# Altium footprint library AD_Lib.PcbLib: 508 footprints (part 4 of 32)
Each footprint in its own frame and in the unit in brackets; x right, y up, seen from the top. Pads: shape width x height; smd on the part's side, far side on the other; paste and mask are expansions set on the pad; w line width, h text height; cw(c..) or ccw(c..) is an arc to the next point about the centre after c.
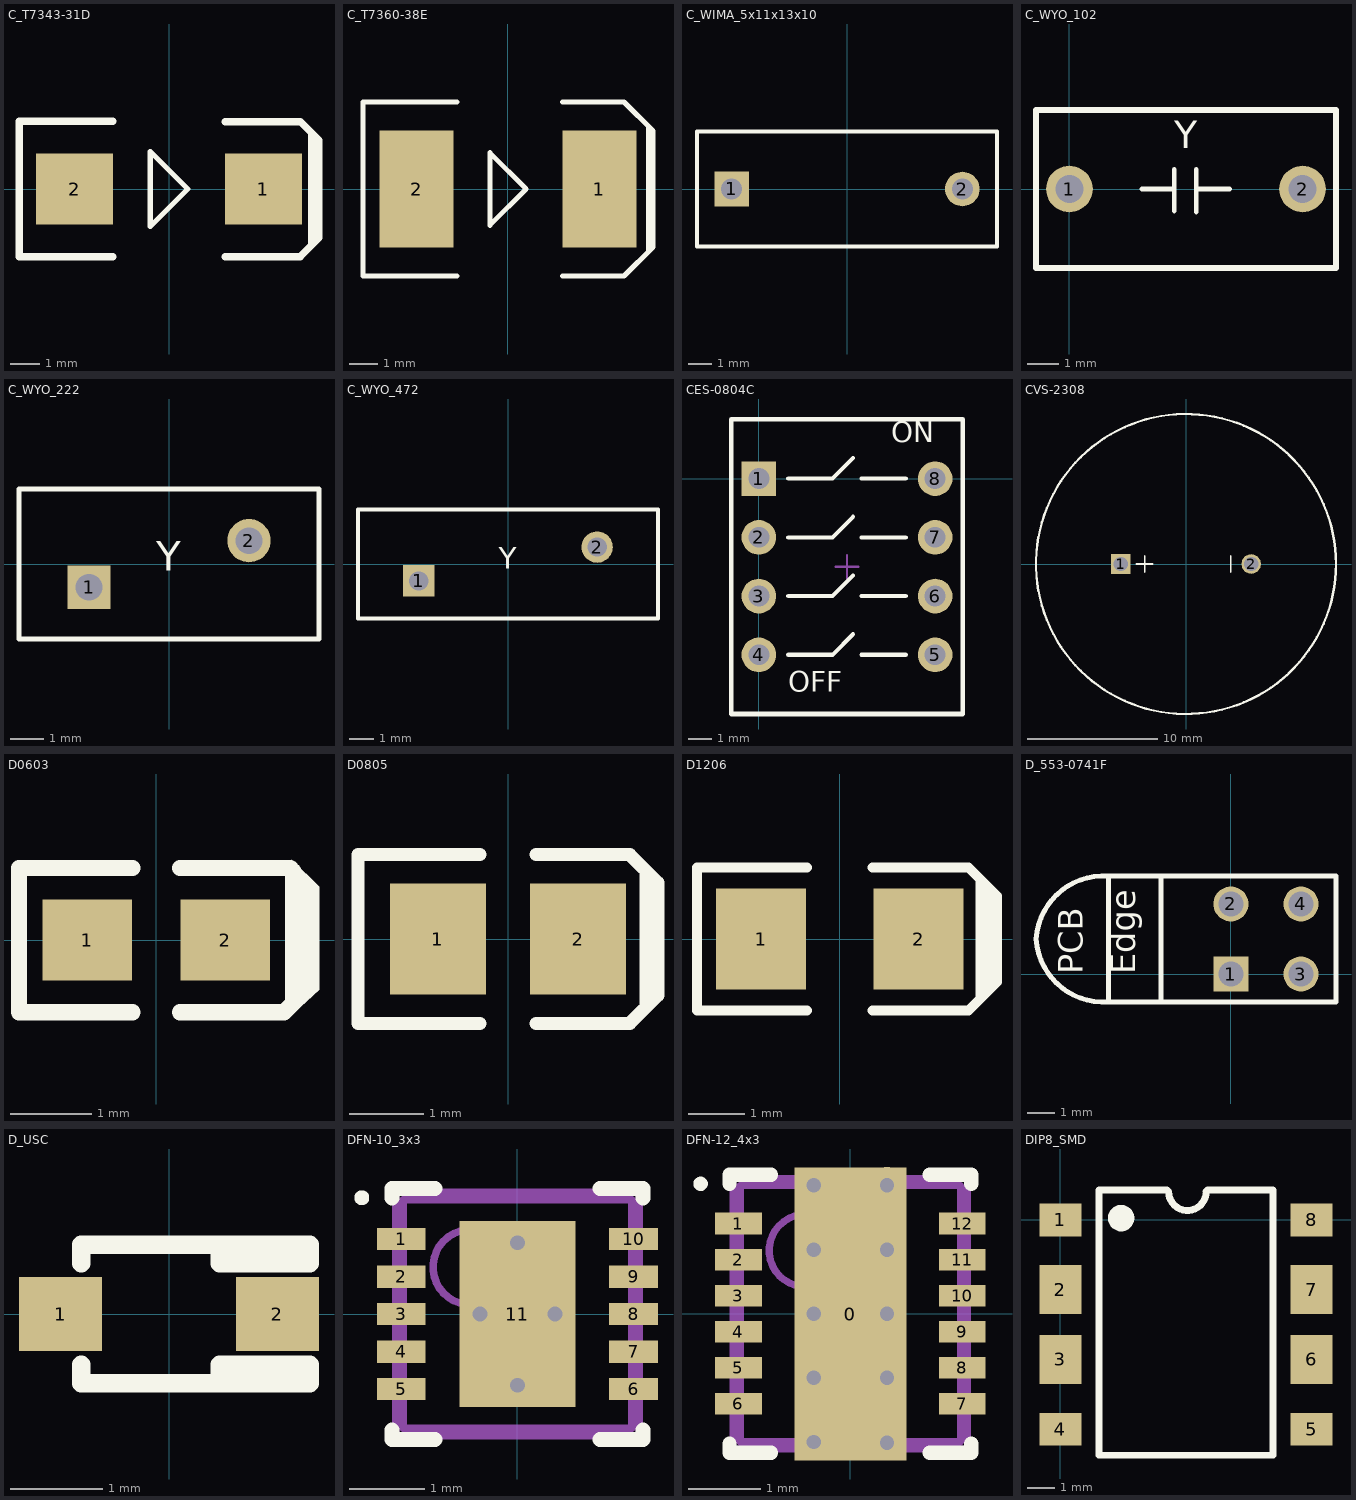
[diagram p3: the footprints below, top view; thin cyan lines are the x and y axes]

## C_T7343-31D [mm] "钽电容；KEMET-D型"
height 2.896
pads (2):
  rect 2.6x2.4 smd: 1(3.2,0) 2(-3.2,0)
Top Overlay:
  rectangle: 4.699,-1.93 4.953,1.905
  lines w0.178: -0.635,-1.27 0.635,0 -0.635,1.27 -0.635,-1.27
  lines w0.254: -1.905,-2.3 -5.08,-2.3 -5.08,2.3 -1.905,2.3 ; 1.905,-2.3 4.445,-2.3 ; 1.905,2.286 4.445,2.286 5.08,1.651 5.08,-1.651 4.445,-2.286

## C_T7360-38E [mm] "钽电容；KEMET-E型"
height 3.454
pads (2):
  rect 2.6x4.1 smd: 1(3.2,0) 2(-3.2,0)
Top Overlay:
  rectangle: 4.826,-2.159 5.004,2.21
  lines w0.178: -1.778,-3.048 -5.08,-3.048 -5.08,3.048 -1.778,3.048 ; 1.905,-3.048 4.064,-3.048 5.08,-2.032 5.08,2.032 4.064,3.048 1.905,3.048 ; -0.635,-1.27 0.635,0 -0.635,1.27 -0.635,-1.27

## C_WIMA_5x11x13x10 [mm] "WIMA电容，WxHxLxPCM"
height 11
pads (2):
  rect 1.5x1.5 hole 0.9: 1(-5,0)
  round 1.5 hole 0.9: 2(5,0)
Top Overlay:
  lines w0.178: -6.5,-2.5 6.5,-2.5 6.5,2.5 -6.5,2.5 -6.5,-2.5

## C_WYO_102 [mm] "Radial Cap, Thru-Hole; 2 Leads; 0.3 in Pin Spacing"
height 6
pads (2):
  round 1.5 hole 0.9: 1(0,0) 2(7.5,0)
Top Overlay:
  lines w0.152: 2.328,0 3.369,0 ; 3.369,-0.711 3.369,0.635 ; 4.08,-0.737 4.08,0.635 ; 4.106,0 5.147,0
  lines w0.203: -1.076,-2.54 -1.076,2.54 8.576,2.54 8.576,-2.54 -1.076,-2.54
  text "Y" at 3.369,1.016 h1.52

## C_WYO_222 [mm] "Vishay WYO系列Y电容"
height 3
pads (2):
  rect 1.3x1.3 hole 0.8 paste+0 mask+0.076: 1(-2.4,-0.7)
  round 1.3 hole 0.8 paste+0 mask+0.076: 2(2.4,0.7)
Top Overlay:
  lines w0.152: -4.5,-2.25 -4.5,2.25 4.5,2.25 4.5,-2.25 -4.5,-2.25
  text "Y" at -0.381,-0.508 h1.52

## C_WYO_472 [mm] "Vishay WYO系列Y电容"
height 12.5
pads (2):
  rect 1.3x1.3 hole 0.8 paste+0 mask+0.076: 1(-3.684,-0.7)
  round 1.3 hole 0.8 paste+0 mask+0.076: 2(3.684,0.7)
Top Overlay:
  lines w0.152: -6.2,-2.25 6.2,-2.25 6.2,2.25 -6.2,2.25 -6.2,-2.25
  text "Y" at -0.381,-0.508 h1.52

## CES-0804C [mm] "DIP; 8 Leads; Row Spacing 7.62 mm; Pitch 2.54 mm"
height 12
pads (8):
  rect 1.5x1.5 hole 0.9: 1(0,0)
  round 1.5 hole 0.9: 2(0,-2.54) 3(0,-5.08) 4(0,-7.62) 5(7.62,-7.62) 6(7.62,-5.08) 7(7.62,-2.54) 8(7.62,0)
Top Overlay:
  lines w0.178: 1.27,-7.62 3.175,-7.62 4.064,-6.731 ; 1.27,-5.08 3.175,-5.08 4.064,-4.191 ; 1.27,-2.54 3.175,-2.54 4.064,-1.651 ; 1.27,0 3.175,0 4.064,0.889 ; 4.445,-7.62 6.35,-7.62 ; 4.445,-5.08 6.35,-5.08 ; 4.445,-2.54 6.35,-2.54 ; 4.445,0 6.35,0
  lines w0.2: -1.19,-10.18 -1.19,2.56 8.81,2.56 8.81,-10.18 -1.19,-10.18
  text "ON" at 5.715,1.27 h1.52
  text "OFF" at 1.27,-9.525 h1.52
Mechanical 15:
  lines w0.1: 3.31,-3.81 4.31,-3.81 ; 3.81,-4.31 3.81,-3.31

## CVS-2308 [mm] "直插扬声器"
height 8.4
pads (2):
  rect 1.5x1.5 hole 1.1: 1(-5,0)
  round 1.5 hole 1.1: 2(5,0)
Top Overlay:
  circle w0.178: c0,0 r11.5
  lines w0.127: -3.81,0 -2.54,0 ; -3.175,-0.635 -3.175,0.635 ; 3.429,-0.635 3.429,0.635

## D0603 [mm] "LED"
height 1.1
pads (2):
  rect 1.1x1 smd: 1(-0.85,0) 2(0.85,0)
Top Overlay:
  region: 1.626,-0.965 1.626,0.946 1.674,0.993 2.007,0.66 2.007,-0.61
  lines w0.2: -0.293,-0.889 -1.69,-0.889 -1.69,0.889 -0.293,0.889 ; 0.293,-0.889 1.575,-0.889 1.69,-0.774 1.69,0.85 1.651,0.889 0.293,0.889

## D0805 [mm] "贴片LED"
height 1.1
pads (2):
  rect 1.3x1.5 smd: 1(-0.95,0) 2(0.95,0)
Top Overlay:
  rectangle: 1.778,-0.889 2.032,0.889
  lines w0.178: -0.381,-1.143 -2.032,-1.143 -2.032,1.143 -0.381,1.143 ; 0.381,-1.143 1.651,-1.143 ; 0.381,1.143 1.651,1.143 2.032,0.762 2.032,-0.762 1.651,-1.143 ; 1.397,-1.143 1.651,-1.143

## D1206 [mm] "公制3216；英制1206；功率1/4W"
height 0.71
pads (2):
  rect 1.6x1.8 smd: 1(-1.4,0) 2(1.4,0)
Top Overlay:
  region: 2.413,-1.143 2.413,1.047 2.461,1.095 2.794,0.762 2.794,-0.762
  lines w0.178: -0.584,-1.27 -2.54,-1.27 -2.54,1.27 -0.584,1.27 ; 0.584,-1.27 2.286,-1.27 2.794,-0.762 2.794,0.762 2.286,1.27 0.584,1.27

## D_553-0741F [mm] "Dialight之直插双色指示灯"
height 9.65
pads (4):
  rect 1.27x1.27 hole 0.9: 1(0,0)
  round 1.27 hole 0.9: 2(0,2.54) 3(2.54,0) 4(2.54,2.54)
Top Overlay:
  lines w0.178: -2.54,-1.016 -2.54,3.556 ; -4.445,-1.016 cw(c-4.61,1.435) -7.061,1.27 cw(c-4.61,1.105) -4.445,3.556 ; -4.445,-1.016 3.81,-1.016 3.81,3.556 -4.445,3.556 ; -4.445,-1.016 -4.445,3.556
  text "Edge" at -3.175,0 h1.52
  text "PCB" at -5.08,0 h1.52

## D_USC [mm] "SOD-323/SC-76; 2 Leads; Body 1.7 x 1.3 mm, (LxW)"
height 1.1
pads (2):
  rect 0.9x0.8 smd: 1(-1.175,0) 2(1.175,0)
Top Overlay:
  lines w0.2: -0.95,-0.55 -0.95,-0.75 1.524,-0.75 1.524,-0.55 0.55,-0.55 0.55,-0.75 ; -0.95,0.55 -0.95,0.75 1.524,0.75 1.524,0.55 0.55,0.55 0.55,0.75

## DFN-10_3x3 [mm] "SON, 10-Leads, Body 3x3mm, Pitch 0.5mm, Microchip Recommended"
height 1
pads (11):
  rect 0.65x0.3 smd: 1(-1.55,1) 2(-1.55,0.5) 3(-1.55,0) 4(-1.55,-0.5) 5(-1.55,-1) 6(1.55,-1) 7(1.55,-0.5) 8(1.55,0) 9(1.55,0.5) 10(1.55,1)
  rect 1.55x2.48 smd: 11(0,0)
via -0.5,0 diameter 0.5 hole 0.2
via 0.5,0 diameter 0.5 hole 0.2
via 0,0.95 diameter 0.5 hole 0.2
via 0,-0.95 diameter 0.5 hole 0.2
Top Overlay:
  circle w0.1: c-2.075,1.55 r0.05
  lines w0.2: -1.675,-1.55 -1.675,-1.675 -1.1,-1.675 ; -1.675,1.55 -1.675,1.675 -1.1,1.675 ; 1.1,-1.675 1.675,-1.675 1.675,-1.55 ; 1.1,1.675 1.675,1.675 1.675,1.55
Mechanical 13:
  circle w0.1: c-0.625,0.625 r0.5
  lines w0.1: -1.525,-1.525 -1.525,1.525 1.525,1.525 1.525,-1.525 -1.525,-1.525
Mechanical 15:
  lines w0.1: -0.5,0 0.5,0 ; 0,-0.5 0,0.5 ; -1.625,-1.625 1.625,-1.625 1.625,1.625 -1.625,1.625 -1.625,-1.625
3D body: height 1, standoff 0, extent -1.524,-1.524 1.524,1.524

## DFN-12_4x3 [mm] "SON, 12-Leads, Body 4x3mm, Pitch 0.5mm, Microchip Recommended"
height 1
pads (13):
  rect 1.55x4.064 smd: 0(0,-0.004)
  rect 0.65x0.3 smd: 1(-1.55,1.25) 2(-1.55,0.75) 3(-1.55,0.25) 4(-1.55,-0.25) 5(-1.55,-0.75) 6(-1.55,-1.25) 7(1.55,-1.25) 8(1.55,-0.75) 9(1.55,-0.25) 10(1.55,0.25) 11(1.55,0.75) 12(1.55,1.25)
via 0.508,0 diameter 0.5 hole 0.2
via -0.508,1.778 diameter 0.5 hole 0.2
via -0.508,-1.778 diameter 0.5 hole 0.2
via -0.508,-0.889 diameter 0.5 hole 0.2
via -0.508,0 diameter 0.5 hole 0.2
via -0.508,0.885 diameter 0.5 hole 0.2
via 0.508,-0.889 diameter 0.5 hole 0.2
via 0.508,0.889 diameter 0.5 hole 0.2
via 0.508,-1.786 diameter 0.5 hole 0.2
via 0.508,1.782 diameter 0.5 hole 0.2
Top Overlay:
  circle w0.1: c-2.075,1.8 r0.05
  lines w0.2: -1.675,-1.8 -1.675,-1.925 -1.1,-1.925 ; -1.675,1.8 -1.675,1.925 -1.1,1.925 ; 1.1,-1.925 1.675,-1.925 1.675,-1.8 ; 1.1,1.925 1.675,1.925 1.675,1.8
Mechanical 13:
  circle w0.1: c-0.625,0.875 r0.5
  lines w0.1: -1.525,-1.775 1.525,-1.775 1.525,1.775 -1.525,1.775 -1.525,-1.775
Mechanical 15:
  lines w0.1: -0.5,0.25 0.5,0.25 ; 0,-0.25 0,0.75 ; -1.625,-1.875 1.625,-1.875 1.625,1.875 -1.625,1.875 -1.625,-1.875
3D body: height 1, standoff 0, extent -1.524,-1.782 1.524,1.774

## DIP8_SMD [mil] "贴片高速光耦（如HCPL-2300）"
height 164.96
pads (8):
  rect 60x47.01 smd: 1(0,0) 4(0,-300) 5(360,-300) 8(360,0)
  rect 60x70 smd: 2(0,-100) 3(0,-200) 6(360,-200) 7(360,-100)
Top Overlay:
  circle w20: c87,2.46 r8.94
  lines w10: 152.96,42.52 55,42.52 55,-337.4 305,-337.4 305,42.52 211,42.52 ; 154.96,40.52 ccw(c181.98,40.52) 209,40.52